# Altium footprint library Connector.PcbLib: 231 footprints (part 4 of 15)
Each footprint in its own frame and in the unit in brackets; x right, y up, seen from the top. Pads: shape width x height; smd on the part's side, far side on the other; paste and mask are expansions set on the pad; w line width, h text height; cw(c..) or ccw(c..) is an arc to the next point about the centre after c.
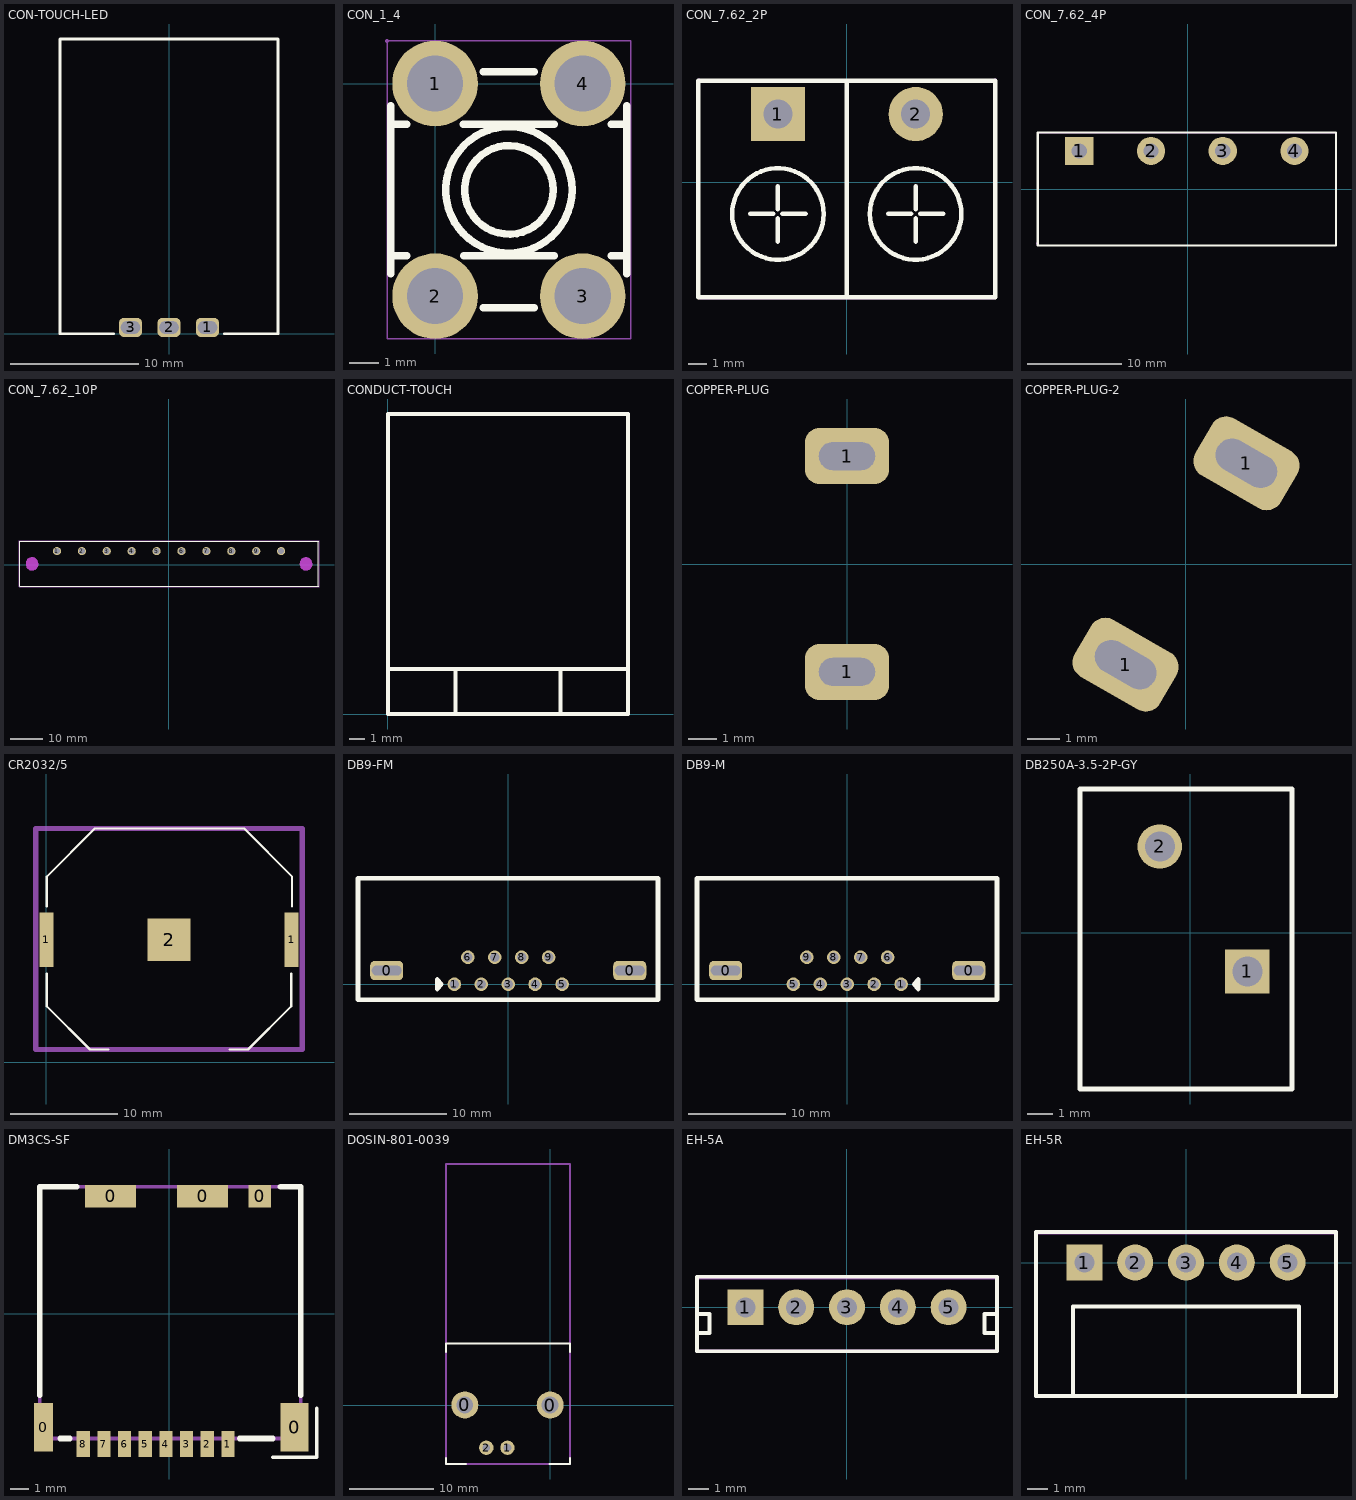
[diagram p3: the footprints below, top view; thin cyan lines are the x and y axes]

## CON-TOUCH-LED [mm]
pads (3):
  rrect50% 1.8x1.5 hole 1 slot 1.5 at 0 deg: 1(3,0.5) 2(0,0.5) 3(-3,0.5)
Top Overlay:
  lines w0.2: -4.3,0 -8.5,0 -8.5,23 8.5,23 8.5,0 4.3,0
3D body: height 0, standoff -3, extent 2.2,0.15 3.4,0.85
3D body: height 0, standoff -3, extent -0.6,0.15 0.6,0.85
3D body: height 0, standoff -3, extent -3.4,0.15 -2.2,0.85
3D body: height 0, standoff -3, extent -3.4,0.1 -2.2,0.8
3D body: height 2.3, standoff 0, extent -8.5,0 8.5,23

## CON_1_4 [mm]
pads (4):
  round 2.9 hole 1.9: 1(0,0) 2(0,-7.2) 3(5,-7.2) 4(5,0)
Top Overlay:
  circle w0.254: c2.5,-3.6 r2.14
  circle w0.254: c2.5,-3.6 r1.5
  lines w0.254: -1.5,-6.444 -1.5,-0.756 ; -1.5,-5.823 -0.963,-5.823 ; -1.5,-1.378 -0.961,-1.378 ; 0.961,-1.378 4.039,-1.378 ; 0.963,-5.823 4.037,-5.823 ; 1.633,-7.6 3.367,-7.6 ; 1.633,0.4 3.367,0.4 ; 5.961,-1.378 6.5,-1.378 ; 5.963,-5.823 6.5,-5.823 ; 6.5,-6.444 6.5,-0.756
Mechanical 15:
  region: -1.567,1.45 -1.567,1.475 -1.602,1.51 -1.652,1.51 -1.687,1.475 -1.687,1.45 -1.687,1.425 -1.652,1.39 -1.602,1.39 -1.567,1.425
  region: 5.85,0 5.849,0.111 5.79,0.326 5.678,0.518 5.52,0.675 5.327,0.785 5.111,0.843 4.889,0.843 4.674,0.785 4.481,0.675 4.323,0.518 4.21,0.326 4.151,0.111 4.15,0 4.151,-0.111 4.21,-0.326 4.323,-0.518 4.481,-0.675 4.674,-0.785 4.889,-0.843 5.111,-0.843 5.326,-0.785 5.52,-0.675 5.678,-0.518 5.79,-0.326 5.849,-0.111
  region: 5.85,-7.2 5.849,-7.089 5.79,-6.874 5.678,-6.682 5.52,-6.525 5.327,-6.415 5.111,-6.357 4.889,-6.357 4.674,-6.415 4.481,-6.525 4.323,-6.682 4.21,-6.874 4.151,-7.089 4.15,-7.2 4.151,-7.311 4.21,-7.526 4.323,-7.718 4.481,-7.875 4.674,-7.985 4.889,-8.043 5.111,-8.043 5.326,-7.985 5.52,-7.875 5.678,-7.718 5.79,-7.526 5.849,-7.311
  region: 0.85,-7.2 0.849,-7.089 0.79,-6.874 0.678,-6.682 0.52,-6.525 0.327,-6.415 0.111,-6.357 -0.111,-6.357 -0.326,-6.415 -0.519,-6.525 -0.677,-6.682 -0.79,-6.874 -0.849,-7.089 -0.85,-7.2 -0.849,-7.311 -0.79,-7.526 -0.677,-7.718 -0.519,-7.875 -0.326,-7.985 -0.111,-8.043 0.111,-8.043 0.326,-7.985 0.52,-7.875 0.678,-7.718 0.79,-7.526 0.849,-7.311
  region: 0.85,0 0.849,0.111 0.79,0.326 0.678,0.518 0.52,0.675 0.327,0.785 0.111,0.843 -0.111,0.843 -0.326,0.785 -0.519,0.675 -0.677,0.518 -0.79,0.326 -0.849,0.111 -0.85,0 -0.849,-0.111 -0.79,-0.326 -0.677,-0.518 -0.519,-0.675 -0.326,-0.785 -0.111,-0.843 0.111,-0.843 0.326,-0.785 0.52,-0.675 0.678,-0.518 0.79,-0.326 0.849,-0.111
  lines w0.051: -1.627,-8.65 -1.627,1.45 6.627,1.45 6.627,-8.65 -1.627,-8.65
3D body "1.step": height 10.23, standoff -1.9, extent -1.585,-7.595 6.615,0.605

## CON_7.62_2P [mm]
pads (2):
  rect 3x3 hole 1.6: 1(-3.81,3.771)
  round 3 hole 1.6: 2(3.81,3.771)
Top Overlay:
  circle w0.254: c3.807,-1.755 r2.53
  circle w0.254: c-3.813,-1.755 r2.53
  lines w0.254: -5.337,-1.755 -4.067,-1.755 ; -3.813,-3.279 -3.813,-2.009 ; -3.813,-1.501 -3.813,-0.231 ; -3.559,-1.755 -2.289,-1.755 ; -0.003,-6.375 -0.003,5.484 ; 2.283,-1.755 3.553,-1.755 ; 3.807,-3.279 3.807,-2.009 ; 3.807,-1.501 3.807,-0.231 ; 4.061,-1.755 5.331,-1.755 ; -8.223,-6.375 8.217,-6.375 8.217,5.625 -8.223,5.625 -8.223,-6.375
Mechanical 6:
  region: -8.131,5.545 -8.131,-6.305 -0.021,-6.305 0.009,-6.275 0.009,-6.475 -8.191,-6.475 -8.291,-6.375 -8.291,5.675 -8.241,5.725 -8.141,5.725
  region: 8.149,5.545 8.149,-6.305 0.039,-6.305 0.009,-6.275 0.009,-6.475 8.209,-6.475 8.309,-6.375 8.309,5.675 8.259,5.725 8.159,5.725
Mechanical 15:
  region: -4.31,4.12 -3.31,4.12 -3.31,3.42 -4.31,3.42
  region: 3.31,4.12 4.31,4.12 4.31,3.42 3.31,3.42
  region: -8.16,-6.375 -8.161,-6.351 -8.196,-6.318 -8.245,-6.317 -8.279,-6.351 -8.28,-6.375 -8.279,-6.4 -8.245,-6.433 -8.196,-6.433 -8.161,-6.4
  lines w0.051: -8.22,-6.375 -8.22,5.625 8.22,5.625 8.22,-6.375 -8.22,-6.375
3D body "KF.step": height 12.5, standoff -4.6, extent -8.22,-6.336 8.22,5.664

## CON_7.62_4P [mm]
pads (4):
  rect 3x3 hole 1.6: 1(-11.532,4.045)
  round 3 hole 1.6: 2(-3.912,4.045) 3(3.708,4.045) 4(11.328,4.045)
Top Overlay:
  lines w0.254: -15.942,-5.994 -15.942,6.006 15.738,6.006 15.738,-5.994 -15.942,-5.994
Mechanical 15:
  region: -10.832,4.045 -10.833,4.136 -10.882,4.312 -10.975,4.47 -11.105,4.598 -11.264,4.689 -11.441,4.736 -11.623,4.736 -11.8,4.689 -11.959,4.598 -12.089,4.47 -12.182,4.312 -12.231,4.136 -12.232,4.045 -12.231,3.954 -12.182,3.778 -12.089,3.62 -11.959,3.492 -11.8,3.401 -11.623,3.354 -11.441,3.354 -11.264,3.401 -11.105,3.492 -10.975,3.62 -10.882,3.778 -10.833,3.954
  region: -3.212,4.045 -3.213,4.136 -3.262,4.312 -3.355,4.47 -3.485,4.598 -3.644,4.689 -3.821,4.736 -4.003,4.736 -4.18,4.689 -4.339,4.598 -4.469,4.47 -4.562,4.312 -4.611,4.136 -4.612,4.045 -4.611,3.954 -4.562,3.778 -4.469,3.62 -4.339,3.492 -4.18,3.401 -4.003,3.354 -3.821,3.354 -3.644,3.401 -3.485,3.492 -3.355,3.62 -3.262,3.778 -3.213,3.954
  region: 4.408,4.045 4.407,4.136 4.358,4.312 4.265,4.47 4.135,4.598 3.976,4.689 3.799,4.736 3.617,4.736 3.44,4.689 3.281,4.598 3.151,4.47 3.058,4.312 3.009,4.136 3.008,4.045 3.009,3.954 3.058,3.778 3.151,3.62 3.281,3.492 3.44,3.401 3.617,3.354 3.799,3.354 3.976,3.401 4.135,3.492 4.265,3.62 4.358,3.778 4.407,3.954
  region: 12.028,4.045 12.027,4.136 11.978,4.312 11.885,4.47 11.755,4.598 11.596,4.689 11.419,4.736 11.237,4.736 11.06,4.689 10.901,4.598 10.771,4.47 10.678,4.312 10.629,4.136 10.628,4.045 10.629,3.954 10.678,3.778 10.771,3.62 10.901,3.492 11.06,3.401 11.237,3.354 11.419,3.354 11.596,3.401 11.755,3.492 11.885,3.62 11.978,3.778 12.027,3.954
  region: -16.009,-5.782 -16.009,-5.757 -16.044,-5.722 -16.094,-5.722 -16.129,-5.757 -16.129,-5.782 -16.129,-5.807 -16.094,-5.842 -16.044,-5.842 -16.009,-5.807
  lines w0.051: -15.942,-5.994 -15.942,6.006 15.738,6.006 15.738,-5.994 -15.942,-5.994
3D body "KF7.step": height 12.5, standoff -4.6, extent -16.018,-5.994 15.663,6.006

## CON_7.62_10P [mm]
pads (10):
  round 2.5 hole 1.8: 1(-34.141,4.181) 2(-26.521,4.181) 3(-18.901,4.181) 4(-11.281,4.181) 5(-3.661,4.181) 6(3.959,4.181) 7(11.579,4.181) 8(19.199,4.181) 9(26.819,4.181) 10(34.439,4.181)
Top Overlay:
  lines w0.254: 45.869,-6.619 45.869,7.181 ; 45.899,-6.619 -45.571,-6.619 -45.571,7.181 45.899,7.181
Keep-Out Layer:
  board cut-out: 43.909,0.281 43.908,0.462 43.835,0.817 43.694,1.152 43.491,1.452 43.234,1.708 42.931,1.909 42.596,2.047 42.24,2.117 41.878,2.117 41.522,2.047 41.187,1.909 40.884,1.708 40.627,1.452 40.424,1.152 40.283,0.817 40.21,0.462 40.209,0.281 40.21,0.1 40.283,-0.256 40.424,-0.59 40.627,-0.891 40.884,-1.146 41.187,-1.347 41.522,-1.485 41.878,-1.555 42.24,-1.555 42.596,-1.485 42.931,-1.347 43.234,-1.146 43.491,-0.891 43.694,-0.59 43.835,-0.256 43.908,0.1
  board cut-out: -39.911,0.281 -39.912,0.462 -39.985,0.817 -40.126,1.152 -40.329,1.452 -40.586,1.708 -40.889,1.909 -41.224,2.047 -41.58,2.117 -41.942,2.117 -42.298,2.047 -42.633,1.909 -42.936,1.708 -43.193,1.452 -43.396,1.152 -43.537,0.817 -43.61,0.462 -43.611,0.281 -43.61,0.1 -43.537,-0.256 -43.396,-0.59 -43.193,-0.891 -42.936,-1.146 -42.633,-1.347 -42.298,-1.485 -41.942,-1.555 -41.58,-1.555 -41.224,-1.485 -40.888,-1.347 -40.586,-1.146 -40.329,-0.891 -40.126,-0.59 -39.985,-0.256 -39.912,0.1
Keep-Out Layer:
  circle w0.025: c42.059,0.281 r1.85
  circle w0.254: c42.059,0.281 r1.85
  circle w0.025: c-41.761,0.281 r1.85
  circle w0.254: c-41.761,0.281 r1.85
Mechanical 1:
  circle w0.025: c42.059,0.281 r1.85
  circle w0.025: c-41.761,0.281 r1.85
Mechanical 15:
  drawing of 17 lines, arcs and shapes, not listed

## CONDUCT-TOUCH [mm]
Top Overlay:
  lines w0.254: 0,3 16,3 ; 4.5,0 4.5,3 ; 11.5,0 11.5,3 ; 0,0 0,20 16,20 16,0 0,0
3D body: height 1.8, standoff 0, extent 0,0 16,20

## COPPER-PLUG [mm]
pads (2):
  rrect50% 3x2 hole 2 slot 1 at 90 deg: 1(0,-3.85) 1(0,3.85)
Mechanical 3:
  lines w0.2: -0.905,-4.35 1,-4.35 1,-3.333 -0.905,-3.333 -0.905,-4.35 ; -0.905,3.398 1,3.398 1,4.35 -0.905,4.35 -0.905,3.398

## COPPER-PLUG-2 [mm]
pads (2):
  rrect50% 2x3 hole 2 slot 1 at 60 deg rot 60: 1(-1.837,-3.062) 1(1.838,3.063)
Mechanical 3:
  lines w0.2: -2.463,-2.294 -2.908,-2.993 -1.257,-4.008 -0.749,-3.12 -2.273,-2.231 ; 0.775,3.103 1.283,3.929 2.871,2.976 2.363,2.088 0.775,3.103

## CR2032/5 [mm]
pads (3):
  rect 1.3x5.08 smd: 1(0,11.43) 1(22.86,11.43)
  rect 3.96x3.96 smd: 2(11.43,11.43)
Top Overlay:
  lines w0.2: 0.04,14.519 0.04,17.29 4.525,21.775 18.425,21.775 22.9,17.3 22.9,14.519 ; 0.05,8.275 0.05,5.225 4.075,1.2 5.775,1.2 ; 17.085,1.2 18.785,1.2 22.81,5.225 22.81,8.275
Mechanical 13:
  lines w0.5: -0.975,1.2 23.825,1.2 23.825,21.775 -0.975,21.775 -0.975,1.2
  text ".Designator" at 11.43,11.808 h2
3D body "CircuitWorks-BATT CR2032.STEP": height 3.2, standoff 0, extent 1.43,1.43 21.43,21.43
3D body "User Library-1-49.STEP": height 3.5, standoff 0, extent -0.02,3.488 22.88,18.958

## DB9-FM [mm]
pads (11):
  rrect50% 3.4x2 hole 1 slot 3.05 at 0 deg: 0(-12.495,1.41) 0(12.495,1.41)
  round 1.4 hole 1: 1(-5.54,0) 2(-2.77,0) 3(0,0) 4(2.77,0) 5(5.54,0) 6(-4.155,2.77) 7(-1.385,2.77) 8(1.385,2.77) 9(4.155,2.77)
Top Overlay:
  lines w0.5: -15.445,-1.6 -15.445,10.9 15.4,10.9 15.4,-1.6 -15.445,-1.6 ; -7.3,-0.5 -7.3,0.5 -6.9,0 -7.3,-0.5
3D body "connector_a-df_09_a_kg-t2.stp": height 12.57, standoff -4.3, extent -15.445,-1.6 15.365,16.7

## DB9-M [mm]
pads (11):
  rrect50% 3.4x2 hole 1 slot 3.05 at 0 deg: 0(-12.495,1.41) 0(12.495,1.41)
  round 1.4 hole 1: 1(5.54,0) 2(2.77,0) 3(0,0) 4(-2.77,0) 5(-5.54,0) 6(4.155,2.77) 7(1.385,2.77) 8(-1.385,2.77) 9(-4.155,2.77)
Top Overlay:
  lines w0.5: -15.445,-1.6 -15.445,10.9 15.4,10.9 15.4,-1.6 -15.445,-1.6 ; 6.9,0 7.3,0.5 7.3,-0.5 6.9,0
3D body "connector_a-df_09_a_kg-t2.stp": height 12.57, standoff -4.3, extent -15.445,-1.6 15.365,16.7

## DB250A-3.5-2P-GY [mm]
pads (2):
  rect 1.778x1.778 hole 1.2: 1(2.275,-1.55)
  round 1.778 hole 1.2: 2(-1.225,3.45)
Top Overlay:
  lines w0.2: -4.425,-6.25 4.075,-6.25 4.075,5.75 -4.425,5.75 -4.425,-6.25

## DM3CS-SF [mm]
pads (13):
  rect 1x2.6 smd: 0(-6.7,-6.05)
  rect 2.7x1.2 smd: 0(-3.125,6.25) 0(1.775,6.25)
  rect 1.2x1.2 smd: 0(4.825,6.25)
  rect 1.5x2.6 smd: 0(6.675,-6.05)
  rect 0.7x1.4 smd: 1(3.125,-6.945) 2(2.025,-6.945) 3(0.925,-6.945) 4(-0.175,-6.945) 5(-1.275,-6.945) 6(-2.375,-6.945) 7(-3.475,-6.945) 8(-4.575,-6.945)
Top Overlay:
  lines w0.2: 5.507,-7.645 7.857,-7.645 7.857,-5.038
  lines w0.3: -6.9,-4.342 -6.9,6.755 -4.925,6.755 ; -5.8,-6.65 -5.304,-6.65 ; 3.756,-6.65 5.507,-6.65 ; 5.925,6.755 7,6.755 7,-4.342
Mechanical 13:
  lines w0.2: -6.9,-6.65 7,-6.65 7,6.755 -6.9,6.755 -6.9,-6.65
  text ".Designator" at -5.1,-3.622 h2

## DOSIN-801-0039 [mm]
pads (4):
  round 3.2 hole 2 unplated: 0(-10.1,0.003) 0(0,0)
  round 1.7 hole 0.9: 1(-5.05,-5.05) 2(-7.55,-5.05)
Top Overlay:
  lines w0.2: -12.328,-6.25 -12.328,-6.975 -9.914,-6.975 ; -12.325,6.247 -12.325,7.275 2.35,7.275 2.35,6.247 ; -0.075,-6.975 2.339,-6.975 2.339,-6.25
Mechanical 13:
  lines w0.2: -12.325,-6.975 -12.325,28.5 2.35,28.5 2.35,-6.975 -12.325,-6.975
  text ".Designator" at -9.825,-2.872 h2
3D body "78m7205_1-1478031-0.stp": height 13.31, standoff -3.65, extent -12.325,-6.975 2.375,28.525

## EH-5A [mm]
pads (5):
  rect 1.8x1.8 hole 1: 1(-5.08,0)
  round 1.8 hole 1: 2(-2.54,0) 3(0,0) 4(2.54,0) 5(5.08,0)
Top Overlay:
  lines w0.2: -7.5,-1.275 -6.875,-1.275 -6.875,-0.35 -7.5,-0.35 ; -7.5,1.5 -7.5,-2.2 7.5,-2.2 7.5,1.525 -7.5,1.525 ; 7.5,-1.275 6.875,-1.275 6.875,-0.35 7.5,-0.35
Mechanical 13:
  lines w0.2: -7.5,-2.2 7.5,-2.2 7.5,1.5 -7.5,1.5 -7.5,-2.2
  text ".Designator" at -4.225,-0.622 h2
3D body "B5B-EH-A.STEP": height 6, standoff -3.2, extent -7.5,-2.2 7.5,1.6

## EH-5R [mm]
pads (5):
  rect 1.8x1.8 hole 1: 1(-5.08,0)
  round 1.8 hole 1: 2(-2.54,0) 3(0,0) 4(2.54,0) 5(5.08,0)
Top Overlay:
  lines w0.2: -7.5,1.5 -7.5,-6.675 7.5,-6.675 7.5,1.525 -7.5,1.525 ; -5.65,-6.675 -5.65,-2.2 5.65,-2.2 5.65,-6.675
Mechanical 13:
  lines w0.2: -7.5,-6.675 7.5,-6.675 7.5,1.5 -7.5,1.5 -7.5,-6.675
  text ".Designator" at -4.7,-3.422 h2
3D body "S5B-EH.STEP": height 4.3, standoff -3.1, extent -7.5,-6.675 7.5,1.525